# Altium footprint library RES_TH.PcbLib: 104 footprints (part 2 of 7)
Each footprint in its own frame and in the unit in brackets; x right, y up, seen from the top. Pads: shape width x height; smd on the part's side, far side on the other; paste and mask are expansions set on the pad; w line width, h text height; cw(c..) or ccw(c..) is an arc to the next point about the centre after c.
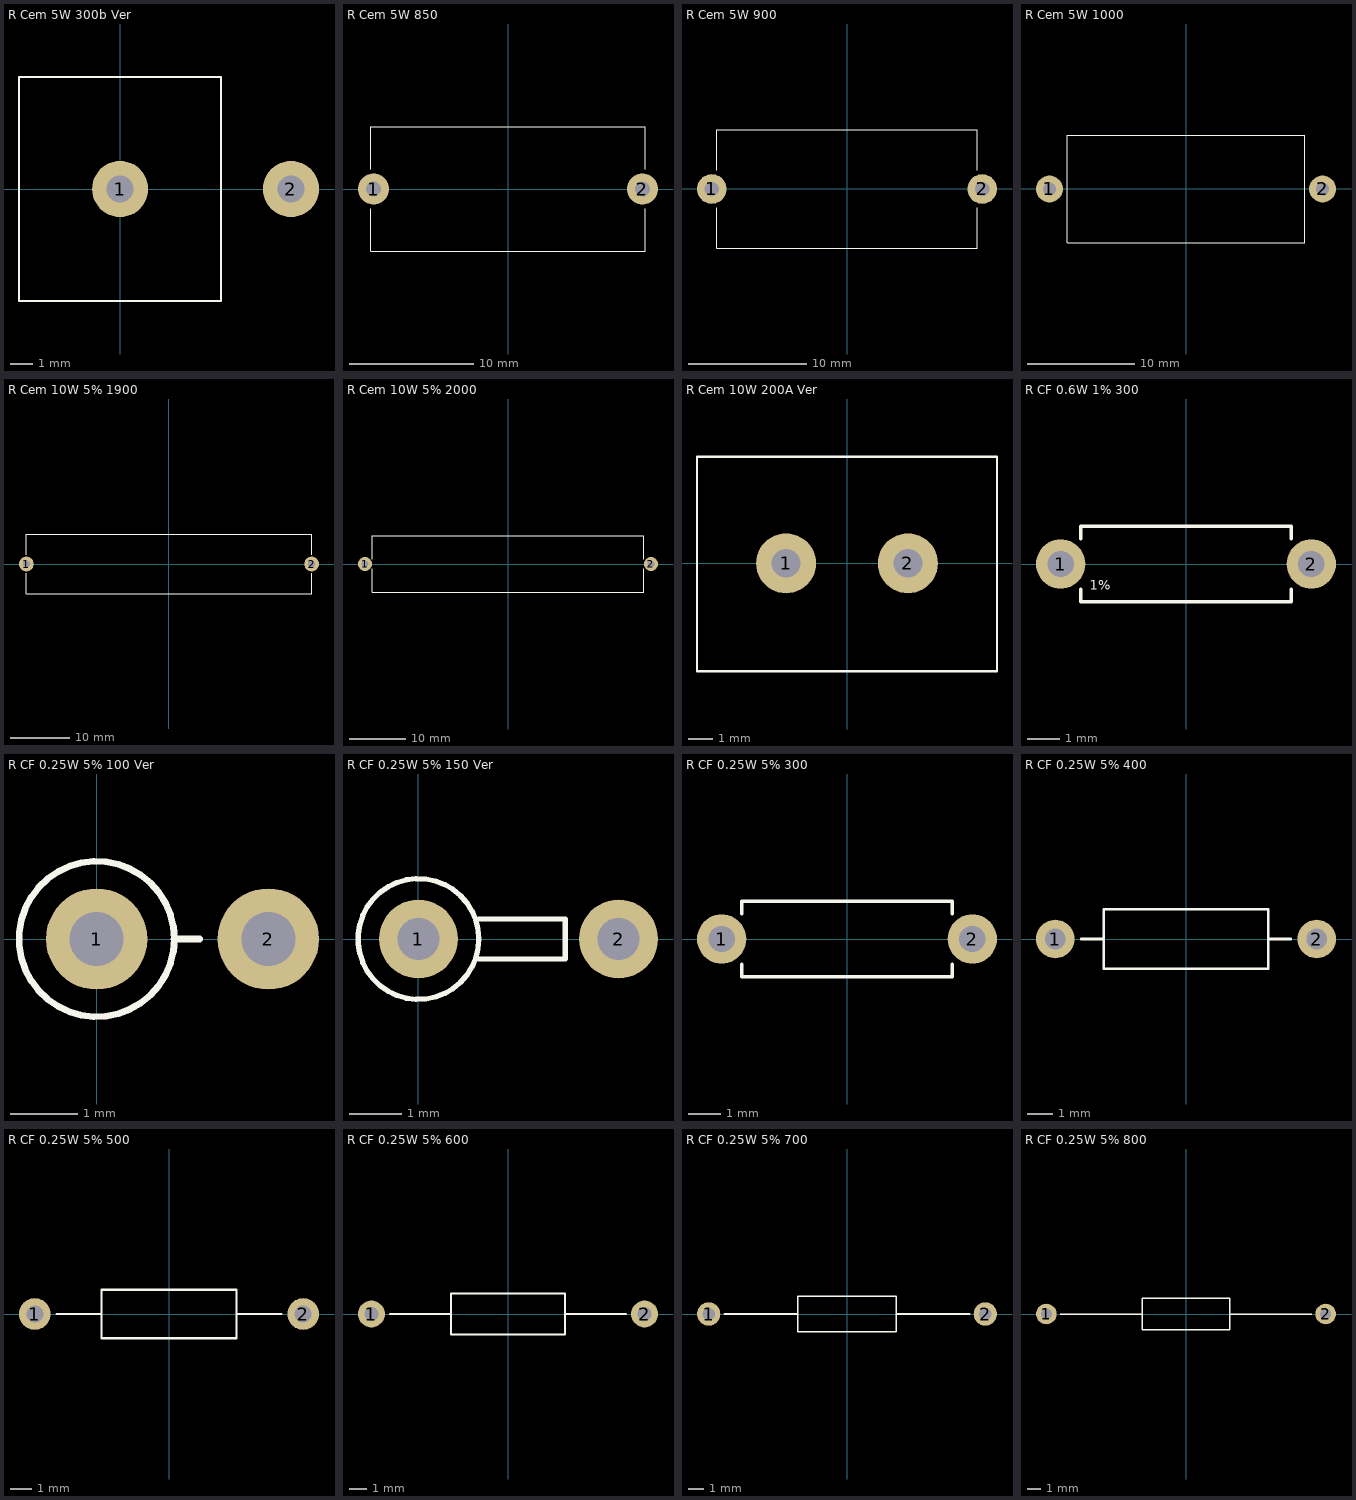
[diagram p1: the footprints below, top view; thin cyan lines are the x and y axes]

## R Cem 5W 300b Ver [mm]
pads (2):
  round 2.5 hole 1.2: 1(0,0) 2(7.62,0)
Top Overlay:
  lines w0.1: -4.51,-5 -4.51,5 4.5,5 4.5,-5 -4.51,-5
3D body "R5W Cem 300B Ver.SLDPRT": height 26.2, standoff -2.5, extent -4.51,-5 8.02,5

## R Cem 5W 850 [mm]
height 10
pads (2):
  round 2.5 hole 1.2: 1(-10.795,0) 2(10.795,0)
Top Overlay:
  lines w0.1: -11.025,-1.6 -11.025,-5 11.025,-5 11.025,-1.6 ; -11.025,1.6 -11.025,5 11.025,5 11.025,1.6
3D body "R5W Cem 850.SLDPRT": height 9.01, standoff -2.5, extent -11.195,-5 11.195,5

## R Cem 5W 900 [mm]
height 10
pads (2):
  round 2.5 hole 1.2: 1(-11.43,0) 2(11.43,0)
Top Overlay:
  lines w0.1: -11.025,-1.6 -11.025,-5 11.025,-5 11.025,-1.6 ; -11.025,1.6 -11.025,5 11.025,5 11.025,1.6
3D body "R5W Cem 900.SLDPRT": height 9.01, standoff -2.5, extent -11.827,-5 11.827,5

## R Cem 5W 1000 [mm]
pads (2):
  round 2.5 hole 1.2: 1(-12.7,0) 2(12.7,0)
Top Overlay:
  lines w0.1: -11.025,-5 -11.025,5 11.025,5 11.025,-5 -11.025,-5
3D body "R5W Cem 1000.SLDPRT": height 9.01, standoff -2.5, extent -13.097,-5 13.097,5

## R Cem 10W 5% 1900 [mm]
height 10
pads (2):
  round 2.5 hole 1.2: 1(-24.13,0) 2(24.13,0)
Top Overlay:
  lines w0.1: -24.13,-1.524 -24.13,-5 24.13,-5 24.13,-1.524 ; -24.13,1.527 -24.13,5 24.13,5 24.13,1.527
3D body "R10W Cem 1900.SLDPRT": height 9.01, standoff -2.5, extent -24.53,-5 24.53,5

## R Cem 10W 5% 2000 [mm]
height 10
pads (2):
  round 2.5 hole 1.2: 1(-25.4,0) 2(25.4,0)
Top Overlay:
  lines w0.1: -24.13,-0.882 -24.13,-5 24.13,-5 24.13,-0.882 ; -24.13,0.886 -24.13,5 24.13,5 24.13,0.886
3D body "R10W Cem 2000.SLDPRT": height 9.01, standoff -2.5, extent -25.797,-5 25.797,5

## R Cem 10W 200A Ver [mm]
pads (2):
  round 2.5 hole 1.2: 1(-2.54,0) 2(2.54,0)
Top Overlay:
  lines w0.1: -6.25,-4.5 -6.25,4.445 6.25,4.445 6.25,-4.5 -6.25,-4.5
3D body "R10W Cem 200A Ver.SLDPRT": height 51, standoff -5, extent -6.25,-4.5 6.25,4.5

## R CF 0.6W 1% 300 [mm]
pads (2):
  round 1.5 hole 0.8: 1(-3.81,0) 2(3.81,0)
Top Overlay:
  lines w0.1: -3.2,-0.762 -3.2,-1.15 3.2,-1.15 3.2,-0.762 ; -3.2,0.762 -3.2,1.15 3.2,1.15 3.2,0.762
  text "1%" at -2.921,-0.889 h0.5
3D body "R0.6W 1% 300.SLDPRT": height 2.3, standoff -2.54, extent -4.108,-1.15 4.108,1.15

## R CF 0.25W 5% 100 Ver [mm]
pads (2):
  round 1.5 hole 0.8: 1(0,0) 2(2.54,0)
Top Overlay:
  circle w0.1: c0,0 r1.15
  lines w0.1: 1.143,0 1.524,0
3D body "R0.25W 5% 100 Ver.SLDPRT": height 8.06, standoff -2.54, extent -1.15,-1.15 2.838,1.15

## R CF 0.25W 5% 150 Ver [mm]
pads (2):
  round 1.5 hole 0.8: 1(0,0) 2(3.81,0)
Top Overlay:
  circle w0.1: c0,0 r1.15
  lines w0.1: 1.143,-0.381 2.794,-0.381 2.794,0.381 1.143,0.381
3D body "R0.25W 5% 150 Ver.SLDPRT": height 8.7, standoff -2.54, extent -1.15,-1.15 4.108,1.15

## R CF 0.25W 5% 300 [mm]
pads (2):
  round 1.5 hole 0.8: 1(-3.81,0) 2(3.81,0)
Top Overlay:
  lines w0.1: -3.2,-0.762 -3.2,-1.15 3.2,-1.15 3.2,-0.762 ; -3.2,0.762 -3.2,1.15 3.2,1.15 3.2,0.762
3D body "R0.25W 5% 300.SLDPRT": height 2.3, standoff -2.54, extent -4.11,-1.15 4.108,1.15

## R CF 0.25W 5% 400 [mm]
pads (2):
  round 1.5 hole 0.8: 1(-5.08,0) 2(5.08,0)
Top Overlay:
  lines w0.1: -4.064,0 -3.2,0 ; 3.2,0 4.064,0 ; -3.2,-1.15 -3.2,1.15 3.2,1.15 3.2,-1.15 -3.2,-1.15
3D body "R0.25W 5% 400.SLDPRT": height 2.3, standoff -2.54, extent -5.378,-1.15 5.378,1.15

## R CF 0.25W 5% 500 [mm]
pads (2):
  round 1.5 hole 0.8: 1(-6.35,0) 2(6.35,0)
Top Overlay:
  lines w0.1: -5.334,0 -3.2,0 ; 3.2,0 5.334,0 ; -3.2,-1.15 -3.2,1.15 3.2,1.15 3.2,-1.15 -3.2,-1.15
3D body "R0.25W 5% 500.SLDPRT": height 2.3, standoff -2.54, extent -6.648,-1.15 6.648,1.15

## R CF 0.25W 5% 600 [mm]
pads (2):
  round 1.5 hole 0.8: 1(-7.62,0) 2(7.62,0)
Top Overlay:
  lines w0.1: -6.604,0 -3.175,0 ; 3.2,0 6.604,0 ; -3.175,-1.15 -3.175,1.15 3.175,1.15 3.175,-1.15 -3.175,-1.15
3D body "R0.25W 5% 600.SLDPRT": height 2.3, standoff -2.54, extent -7.918,-1.15 7.918,1.15

## R CF 0.25W 5% 700 [mm]
pads (2):
  round 1.5 hole 0.8: 1(-8.89,0) 2(8.89,0)
Top Overlay:
  lines w0.1: -7.874,0 -3.175,0 ; 3.2,0 7.874,0 ; -3.175,-1.15 -3.175,1.15 3.175,1.15 3.175,-1.15 -3.175,-1.15
3D body "R0.25W 5% 700.SLDPRT": height 2.3, standoff -2.54, extent -9.188,-1.15 9.188,1.15

## R CF 0.25W 5% 800 [mm]
pads (2):
  round 1.5 hole 0.8: 1(-10.16,0) 2(10.16,0)
Top Overlay:
  lines w0.1: -9.144,0 -3.175,0 ; 3.2,0 9.144,0 ; -3.175,-1.15 -3.175,1.15 3.175,1.15 3.175,-1.15 -3.175,-1.15
3D body "R0.25W 5% 800.SLDPRT": height 2.3, standoff -2.54, extent -10.458,-1.15 10.458,1.15